# Altium footprint library mmyLibrary.PcbLib: 231 footprints (part 11 of 15)
Each footprint in its own frame and in the unit in brackets; x right, y up, seen from the top. Pads: shape width x height; smd on the part's side, far side on the other; paste and mask are expansions set on the pad; w line width, h text height; cw(c..) or ccw(c..) is an arc to the next point about the centre after c.
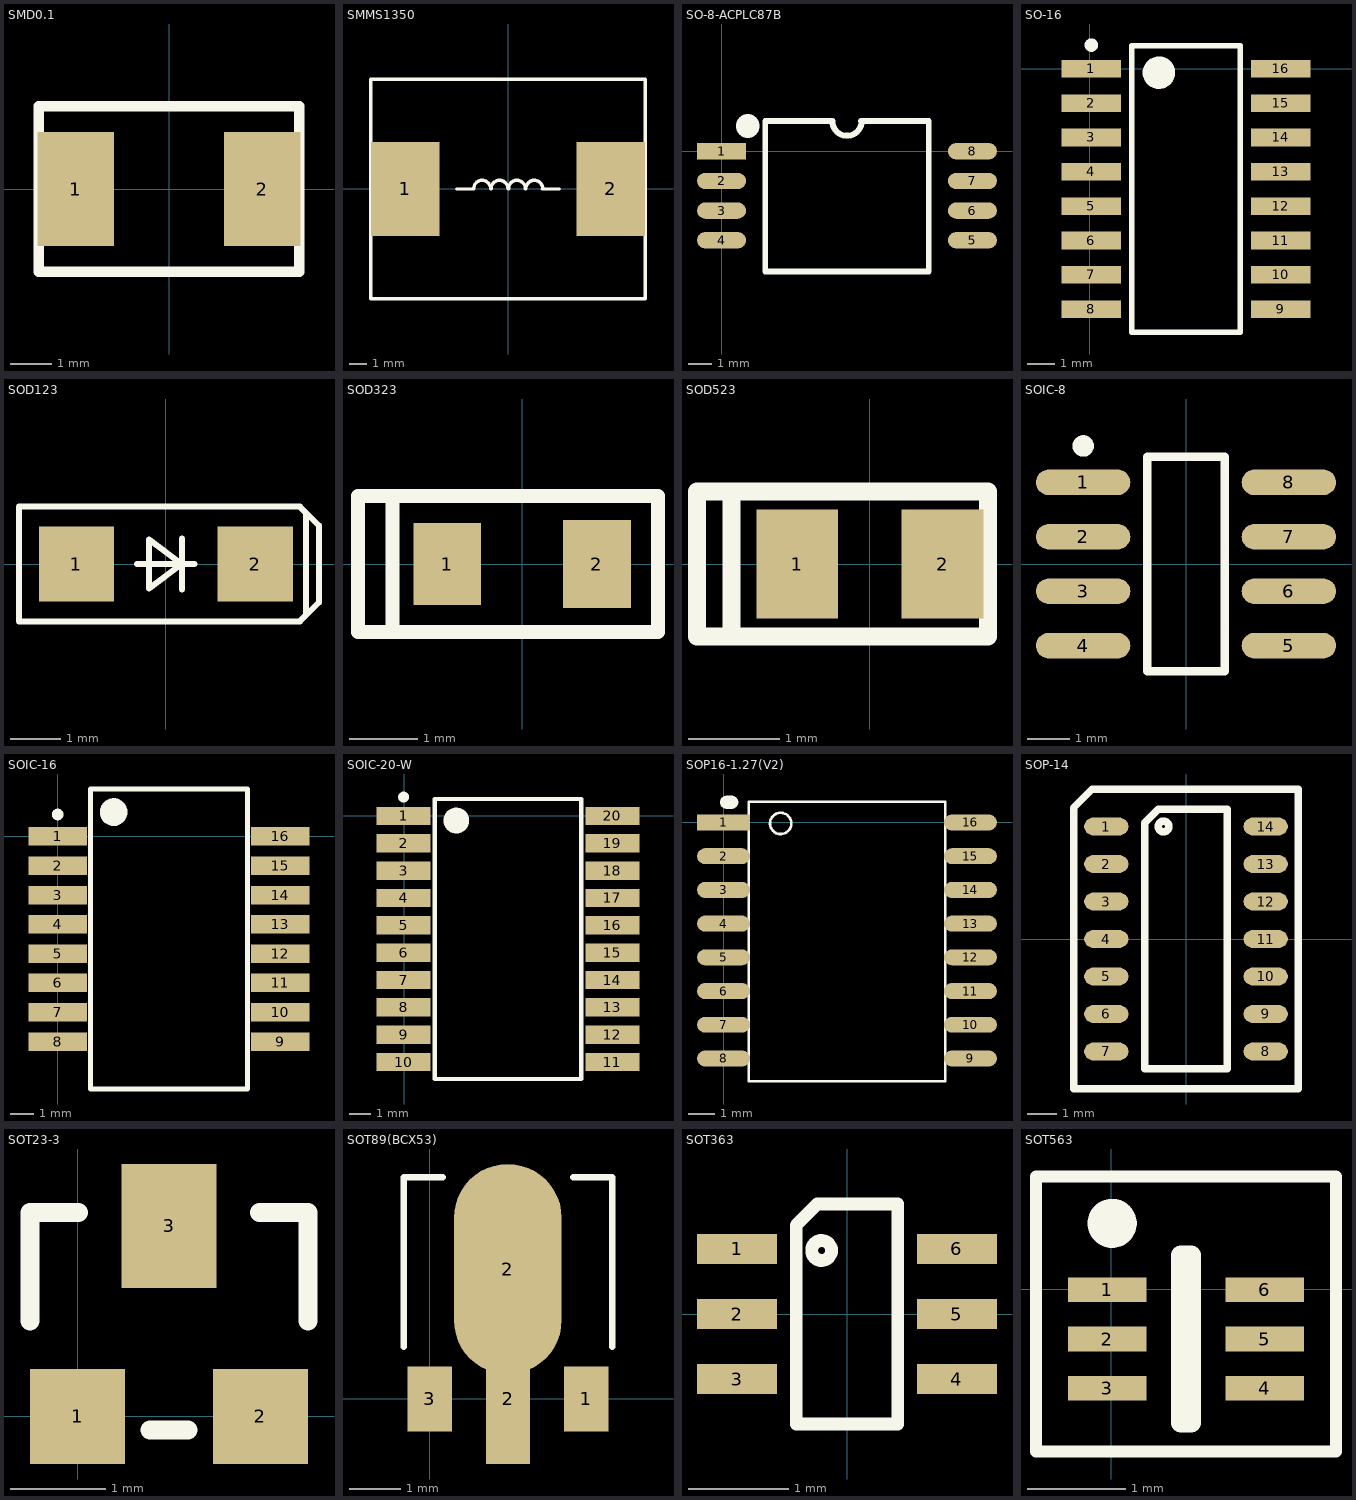
[diagram p10: the footprints below, top view; thin cyan lines are the x and y axes]

## SMD0.1 [mm]
pads (2):
  rect 1.85x2.75 smd: 1(-2.25,0) 2(2.25,0)
Top Overlay:
  lines w0.254: -3.15,-2 -3.15,2 3.15,2 3.15,-2 -3.15,-2

## SMMS1350 [mm] "顺翔络"
pads (2):
  rect 4x5.5 smd: 1(-6,0) 2(6,0)
Top Overlay:
  lines w0.2: -3,0 -2,0 cw(c-1.508,0.016) -1.524,0.508 cw(c-1.524,0) -1.016,0 ; -0.984,0 cw(c-0.492,0.016) -0.508,0.508 cw(c-0.508,0) 0,0 ; 0.032,0 cw(c0.524,0.016) 0.508,0.508 cw(c0.508,0) 1.016,0 ; 1.048,0 cw(c1.54,0.016) 1.524,0.508 cw(c1.524,0) 2.032,0 ; 2,0 3,0 ; -8,-6.4 8,-6.4 8,6.4 -8,6.4 -8,-6.4

## SO-8-ACPLC87B [mm]
pads (8):
  rect 2.1x0.7 smd: 1(0,0)
  oval 2.1x0.7 smd: 2(0,-1.27) 3(0,-2.54) 4(0,-3.81) 5(10.745,-3.81) 6(10.745,-2.54) 7(10.745,-1.27) 8(10.745,0)
Top Overlay:
  lines w0.254: 1.872,-5.155 8.872,-5.155 ; 1.872,-5.105 1.872,1.295 4.672,1.295 ; 4.743,1.295 ccw(c5.372,1.295) 6.002,1.295 ; 5.972,1.295 8.872,1.295 8.872,-5.105
  lines w1.016: 1.122,1.075 1.122,1.095

## SO-16 [mm]
pads (16):
  rect 2.2x0.65 smd: 1(0.056,0) 2(0.056,-1.27) 3(0.056,-2.54) 4(0.056,-3.81) 5(0.056,-5.08) 6(0.056,-6.35) 7(0.056,-7.62) 8(0.056,-8.89) 9(7.056,-8.89) 10(7.056,-7.62) 11(7.056,-6.35) 12(7.056,-5.08) 13(7.056,-3.81) 14(7.056,-2.54) 15(7.056,-1.27) 16(7.056,0)
Top Overlay:
  circle w0.25: c0.056,0.875 r0.125
  circle w0.6: c2.556,-0.145 r0.3
  lines w0.2: 1.556,-9.745 1.556,0.855 5.556,0.855 5.556,-9.745 1.556,-9.745
3D body "CircuitWorks-SO-16.STEP": height 1.45, standoff 0, extent 0.572,-9.436 6.477,0.546

## SOD123 [mm]
pads (2):
  rect 1.5x1.5 smd: 1(-1.778,0) 2(1.778,0)
Top Overlay:
  lines w0.12: -0.572,0 0.572,0 ; 0.318,-0.508 0.318,0.508 ; 2.794,-1.016 2.794,1.016 ; -2.921,-1.143 -2.921,1.143 2.667,1.143 3.048,0.762 3.048,-0.762 2.667,-1.143 -2.921,-1.143 ; -0.333,-0.488 0.318,0 -0.333,0.488 -0.333,-0.488
3D body "User Library-SOD123-1.STEP": height 1.18, standoff 0, extent -1.95,-0.9 1.95,0.9

## SOD323 [mm]
pads (2):
  rect 1x1.2 smd: 1(-1.1,0)
  rect 1x1.3 smd: 2(1.1,0)
Top Overlay:
  lines w0.2: -1.905,-0.889 -1.905,0.889 ; -2.413,-1 2,-1 2,1 -2.413,1 -2.413,-1
3D body "User Library-SOD-323.STEP": height 1.1, standoff 0, extent -1.427,-0.715 1.173,0.635

## SOD523 [mm]
pads (2):
  rect 0.9x1.2 smd: 1(-0.8,0) 2(0.8,0)
Top Overlay:
  lines w0.2: -1.524,-0.762 -1.524,0.762 ; -1.905,-0.8 1.3,-0.8 1.3,0.8 -1.905,0.8 -1.905,-0.8

## SOIC-8 [mm]
pads (8):
  oval 2.2x0.6 smd: 1(-2.4,1.905) 2(-2.4,0.635) 3(-2.4,-0.635) 4(-2.4,-1.905) 5(2.4,-1.905) 6(2.4,-0.635) 7(2.4,0.635) 8(2.4,1.905)
Top Overlay:
  circle w0.25: c-2.4,2.755 r0.125
  lines w0.2: -0.9,-2.5 0.9,-2.5 0.9,2.5 -0.9,2.5 -0.9,-2.5
3D body "User Library-SOIC127P610X343-8N.STEP": height 3.48, standoff 0, extent -2.873,-2.92 3.127,2.92

## SOIC-16 [mm]
pads (16):
  rect 2.54x0.8 smd: 1(0,0) 2(0,-1.27) 3(0,-2.54) 4(0,-3.81) 5(0,-5.08) 6(0,-6.35) 7(0,-7.62) 8(0,-8.89) 9(9.65,-8.89) 10(9.65,-7.62) 11(9.65,-6.35) 12(9.65,-5.08) 13(9.65,-3.81) 14(9.65,-2.54) 15(9.65,-1.27) 16(9.65,0)
Top Overlay:
  circle w0.6: c2.425,1.055 r0.3
  circle w0.25: c0,0.95 r0.125
  lines w0.2: 1.425,-10.945 8.225,-10.945 8.225,2.055 1.425,2.055 1.425,-10.945
3D body "User Library-SOIC16_Wide_JEDEC_MS-013AA.STEP": height 2.72, standoff 0.07, extent -0.489,-9.695 10.141,0.805

## SOIC-20-W [mm]
pads (20):
  rect 2.5x0.85 smd: 1(-0.024,0) 2(-0.024,-1.27) 3(-0.024,-2.54) 4(-0.024,-3.81) 5(-0.024,-5.08) 6(-0.024,-6.35) 7(-0.024,-7.62) 8(-0.024,-8.89) 9(-0.024,-10.16) 10(-0.024,-11.43) 11(9.676,-11.43) 12(9.676,-10.16) 13(9.676,-8.89) 14(9.676,-7.62) 15(9.676,-6.35) 16(9.676,-5.08) 17(9.676,-3.81) 18(9.676,-2.54) 19(9.676,-1.27) 20(9.676,0)
Top Overlay:
  circle w0.6: c2.426,-0.215 r0.3
  circle w0.25: c-0.024,0.875 r0.125
  lines w0.2: 1.426,-12.215 8.226,-12.215 8.226,0.785 1.426,0.785 1.426,-12.215
3D body "User Library-SOIC20_JEDEC_MS-013AC.STEP": height 2.66, standoff 0, extent -0.616,-12.215 10.014,0.785

## SOP16-1.27(V2) [mm] "金升阳2"
pads (17):
  rect 2x0.6 smd: 1(0,0)
  oval 2x0.6 smd: 2(0,-1.27) 3(0,-2.54) 4(0,-3.81) 5(0,-5.08) 6(0,-6.35) 7(0,-7.62) 8(0,-8.89) 9(9.3,-8.89) 10(9.3,-7.62) 11(9.3,-6.35) 12(9.3,-5.08) 13(9.3,-3.81) 14(9.3,-2.54) 15(9.3,-1.27) 16(9.3,0)
  oval 0.7x0.5 on Top Overlay mask+0.051: ""(0.21,0.762)
Top Overlay:
  circle w0.1: c2.151,-0.037 r0.4
  lines w0.1: 0.95,-9.744 8.35,-9.744 8.35,0.785 0.95,0.785 0.95,-9.744
3D body "User Library-SOIC16_Wide_JEDEC_MS-013AA.STEP": height 2.62, standoff -0.03, extent -0.743,-9.695 9.887,0.805

## SOP-14 [mm]
pads (14):
  rrect100% 1.5x0.6 smd: 1(-2.7,3.81) 2(-2.7,2.54) 3(-2.7,1.27) 4(-2.7,0) 5(-2.7,-1.27) 6(-2.7,-2.54) 7(-2.7,-3.81) 8(2.7,-3.81) 9(2.7,-2.54) 10(2.7,-1.27) 11(2.7,0) 12(2.7,1.27) 13(2.7,2.54) 14(2.7,3.81)
Top Overlay:
  circle w0.254: c-0.762,3.81 r0.18
  lines w0.254: -3.81,-5.08 3.81,-5.08 3.81,5.08 -3.175,5.08 -3.81,4.445 -3.81,-5.08 ; -1.4,-4.4 1.4,-4.4 1.4,4.4 -0.934,4.4 -1.4,3.934 -1.4,-4.4

## SOT23-3 [mm] "TL431"
pads (3):
  rect 1x1 smd: 1(0,0) 2(1.92,0)
  rect 1x1.3 smd: 3(0.96,2)
Top Overlay:
  lines w0.2: -0.5,1 -0.5,2.143 0.008,2.143 ; 0.76,-0.143 1.16,-0.143 ; 1.913,2.143 2.42,2.143 2.42,1

## SOT89(BCX53) [mil] "TOSHIBA"
pads (4):
  rect 34x50 smd: 1(120,0) 3(0,0)
  oval 82.68x161.42 smd: 2(59.84,99.61)
  rect 34x100 smd: 2(60,0)
Top Overlay:
  lines w5: -20,40 -20,170 10,170 ; 110,170 140,170 140,40

## SOT363 [mm]
pads (6):
  rect 0.8x0.3 smd: 1(-1.1,0.65) 2(-1.1,0) 3(-1.1,-0.65) 4(1.1,-0.65) 5(1.1,0) 6(1.1,0.65)
Top Overlay:
  circle w0.127: c-0.254,0.635 r0.1
  lines w0.127: -0.508,-1.1 -0.508,0.889 -0.297,1.1 0.508,1.1 0.508,-1.1 -0.508,-1.1

## SOT563 [mm]
pads (6):
  rect 0.8x0.25 smd: 1(-0.038,-0.008) 2(-0.038,-0.508) 3(-0.038,-1.008) 4(1.562,-1.008) 5(1.562,-0.508) 6(1.562,-0.008)
Top Overlay:
  circle w0.25: c0.012,0.667 r0.125
  lines w0.12: -0.762,-1.651 2.286,-1.651 2.286,1.143 -0.762,1.143 -0.762,-1.651
  lines w0.2: 0.712,-1.358 0.812,-1.358 0.812,0.342 0.712,0.342 0.712,-1.358
Mechanical 15:
  lines w0.1: 0.762,-1.008 0.762,-0.008
3D body "User Library-SOT-563_TI.STEP": height 0.59, standoff 0, extent -0.001,-1.308 1.625,0.292